# Altium footprint library Connector_Samtec_HLE_SMD.PcbLib: 290 footprints (part 10 of 24) (continued)
## Samtec_HLE-127-02-xxx-DV-BE_2x27_P2.54mm_Horizontal [mm]
pads (108):
  rect 1.27x1.68 smd: 1(-33.02,2.72) 2(-33.02,-2.72) 3(-30.48,2.72) 4(-30.48,-2.72) 5(-27.94,2.72) 6(-27.94,-2.72) 7(-25.4,2.72) 8(-25.4,-2.72) 9(-22.86,2.72) 10(-22.86,-2.72) 11(-20.32,2.72) 12(-20.32,-2.72) 13(-17.78,2.72) 14(-17.78,-2.72) 15(-15.24,2.72) 16(-15.24,-2.72) 17(-12.7,2.72) 18(-12.7,-2.72) 19(-10.16,2.72) 20(-10.16,-2.72) 21(-7.62,2.72) 22(-7.62,-2.72) 23(-5.08,2.72) 24(-5.08,-2.72) 25(-2.54,2.72) 26(-2.54,-2.72) 27(0,2.72) 28(0,-2.72) 29(2.54,2.72) 30(2.54,-2.72) 31(5.08,2.72) 32(5.08,-2.72) 33(7.62,2.72) 34(7.62,-2.72) 35(10.16,2.72) 36(10.16,-2.72) 37(12.7,2.72) 38(12.7,-2.72) 39(15.24,2.72) 40(15.24,-2.72) 41(17.78,2.72) 42(17.78,-2.72) 43(20.32,2.72) 44(20.32,-2.72) 45(22.86,2.72) 46(22.86,-2.72) 47(25.4,2.72) 48(25.4,-2.72) 49(27.94,2.72) 50(27.94,-2.72) 51(30.48,2.72) 52(30.48,-2.72) 53(33.02,2.72) 54(33.02,-2.72)
  round 0.97 hole 0.97: Un1(-2.54,-1.27) Un2(33.02,-1.27) Un3(-20.32,1.27) Un4(15.24,-1.27) Un5(-10.16,-1.27) Un6(12.7,1.27) Un7(-30.48,-1.27) Un8(15.24,1.27) Un9(2.54,1.27) Un10(-15.24,1.27) Un11(5.08,1.27) Un12(-27.94,1.27) Un13(-17.78,1.27) Un14(-27.94,-1.27) Un15(22.86,-1.27) Un16(25.4,1.27) Un17(-17.78,-1.27) Un18(-22.86,-1.27) Un19(-20.32,-1.27) Un20(-22.86,1.27) Un21(22.86,1.27) Un22(-25.4,1.27) Un23(5.08,-1.27) Un24(7.62,-1.27) Un25(-2.54,1.27) Un26(17.78,-1.27) Un27(-15.24,-1.27) Un28(20.32,1.27) Un29(30.48,1.27) Un30(-12.7,1.27) Un31(0,-1.27) Un32(-5.08,1.27) Un33(-7.62,-1.27) Un34(27.94,-1.27) Un35(-25.4,-1.27) Un36(-30.48,1.27) Un37(20.32,-1.27) Un38(-33.02,1.27) Un39(33.02,1.27) Un40(-33.02,-1.27) Un41(25.4,-1.27) Un42(-10.16,1.27) Un43(30.48,-1.27) Un44(27.94,1.27) Un45(12.7,-1.27) Un46(-7.62,1.27) Un47(0,1.27) Un48(2.54,-1.27) Un49(-5.08,-1.27) Un50(17.78,1.27) Un51(7.62,1.27) Un52(-12.7,-1.27) Un53(10.16,1.27) Un54(10.16,-1.27)
F.SilkS:
  lines w0.12: -33.915,-2.65 -34.4,-2.65 -34.4,2.65 -33.915,2.65 -33.915,3.56 ; -32.125,-2.65 -31.375,-2.65 ; -32.125,2.65 -31.375,2.65 ; -29.585,-2.65 -28.835,-2.65 ; -29.585,2.65 -28.835,2.65 ; -27.045,-2.65 -26.295,-2.65 ; -27.045,2.65 -26.295,2.65 ; -24.505,-2.65 -23.755,-2.65 ; -24.505,2.65 -23.755,2.65 ; -21.965,-2.65 -21.215,-2.65 ; -21.965,2.65 -21.215,2.65 ; -19.425,-2.65 -18.675,-2.65 ; -19.425,2.65 -18.675,2.65 ; -16.885,-2.65 -16.135,-2.65 ; -16.885,2.65 -16.135,2.65 ; -14.345,-2.65 -13.595,-2.65 ; -14.345,2.65 -13.595,2.65 ; -11.805,-2.65 -11.055,-2.65 ; -11.805,2.65 -11.055,2.65 ; -9.265,-2.65 -8.515,-2.65 ; -9.265,2.65 -8.515,2.65 ; -6.725,-2.65 -5.975,-2.65 ; -6.725,2.65 -5.975,2.65 ; -4.185,-2.65 -3.435,-2.65 ; -4.185,2.65 -3.435,2.65 ; -1.645,-2.65 -0.895,-2.65 ; -1.645,2.65 -0.895,2.65 ; 0.895,-2.65 1.645,-2.65 ; 0.895,2.65 1.645,2.65 ; 3.435,-2.65 4.185,-2.65 ; 3.435,2.65 4.185,2.65 ; 5.975,-2.65 6.725,-2.65 ; 5.975,2.65 6.725,2.65 ; 8.515,-2.65 9.265,-2.65 ; 8.515,2.65 9.265,2.65 ; 11.055,-2.65 11.805,-2.65 ; 11.055,2.65 11.805,2.65 ; 13.595,-2.65 14.345,-2.65 ; 13.595,2.65 14.345,2.65 ; 16.135,-2.65 16.885,-2.65 ; 16.135,2.65 16.885,2.65 ; 18.675,-2.65 19.425,-2.65 ; 18.675,2.65 19.425,2.65 ; 21.215,-2.65 21.965,-2.65 ; 21.215,2.65 21.965,2.65 ; 23.755,-2.65 24.505,-2.65 ; 23.755,2.65 24.505,2.65 ; 26.295,-2.65 27.045,-2.65 ; 26.295,2.65 27.045,2.65 ; 28.835,-2.65 29.585,-2.65 ; 28.835,2.65 29.585,2.65 ; 31.375,-2.65 32.125,-2.65 ; 31.375,2.65 32.125,2.65 ; 33.915,-2.65 34.4,-2.65 34.4,2.65 33.915,2.65
F.CrtYd:
  lines w0.05: -34.79,-4.06 -34.79,4.06 34.79,4.06 34.79,-4.06 -34.79,-4.06
F.Fab:
  lines w0.1: -33.52,2.54 -33.02,1.833 -32.52,2.54 ; -34.29,-2.54 34.29,-2.54 34.29,2.54 -34.29,2.54 -34.29,-2.54
  text "'.Designator'" at -4.047,-2.68 h1

## Samtec_HLE-127-02-xxx-DV-LC_2x27_P2.54mm_Horizontal [mm]
pads (56):
  rect 1.27x2.29 smd: 1(-33.02,2.525) 2(-33.02,-2.525) 3(-30.48,2.525) 4(-30.48,-2.525) 5(-27.94,2.525) 6(-27.94,-2.525) 7(-25.4,2.525) 8(-25.4,-2.525) 9(-22.86,2.525) 10(-22.86,-2.525) 11(-20.32,2.525) 12(-20.32,-2.525) 13(-17.78,2.525) 14(-17.78,-2.525) 15(-15.24,2.525) 16(-15.24,-2.525) 17(-12.7,2.525) 18(-12.7,-2.525) 19(-10.16,2.525) 20(-10.16,-2.525) 21(-7.62,2.525) 22(-7.62,-2.525) 23(-5.08,2.525) 24(-5.08,-2.525) 25(-2.54,2.525) 26(-2.54,-2.525) 27(0,2.525) 28(0,-2.525) 29(2.54,2.525) 30(2.54,-2.525) 31(5.08,2.525) 32(5.08,-2.525) 33(7.62,2.525) 34(7.62,-2.525) 35(10.16,2.525) 36(10.16,-2.525) 37(12.7,2.525) 38(12.7,-2.525) 39(15.24,2.525) 40(15.24,-2.525) 41(17.78,2.525) 42(17.78,-2.525) 43(20.32,2.525) 44(20.32,-2.525) 45(22.86,2.525) 46(22.86,-2.525) 47(25.4,2.525) 48(25.4,-2.525) 49(27.94,2.525) 50(27.94,-2.525) 51(30.48,2.525) 52(30.48,-2.525) 53(33.02,2.525) 54(33.02,-2.525)
  round 1.19 hole 1.19: Un1(-31.75,0) Un2(31.75,0)
F.SilkS:
  lines w0.12: -33.915,-2.65 -34.4,-2.65 -34.4,2.65 -33.915,2.65 -33.915,3.67 ; -32.125,-2.65 -31.375,-2.65 ; -32.125,2.65 -31.375,2.65 ; -29.585,-2.65 -28.835,-2.65 ; -29.585,2.65 -28.835,2.65 ; -27.045,-2.65 -26.295,-2.65 ; -27.045,2.65 -26.295,2.65 ; -24.505,-2.65 -23.755,-2.65 ; -24.505,2.65 -23.755,2.65 ; -21.965,-2.65 -21.215,-2.65 ; -21.965,2.65 -21.215,2.65 ; -19.425,-2.65 -18.675,-2.65 ; -19.425,2.65 -18.675,2.65 ; -16.885,-2.65 -16.135,-2.65 ; -16.885,2.65 -16.135,2.65 ; -14.345,-2.65 -13.595,-2.65 ; -14.345,2.65 -13.595,2.65 ; -11.805,-2.65 -11.055,-2.65 ; -11.805,2.65 -11.055,2.65 ; -9.265,-2.65 -8.515,-2.65 ; -9.265,2.65 -8.515,2.65 ; -6.725,-2.65 -5.975,-2.65 ; -6.725,2.65 -5.975,2.65 ; -4.185,-2.65 -3.435,-2.65 ; -4.185,2.65 -3.435,2.65 ; -1.645,-2.65 -0.895,-2.65 ; -1.645,2.65 -0.895,2.65 ; 0.895,-2.65 1.645,-2.65 ; 0.895,2.65 1.645,2.65 ; 3.435,-2.65 4.185,-2.65 ; 3.435,2.65 4.185,2.65 ; 5.975,-2.65 6.725,-2.65 ; 5.975,2.65 6.725,2.65 ; 8.515,-2.65 9.265,-2.65 ; 8.515,2.65 9.265,2.65 ; 11.055,-2.65 11.805,-2.65 ; 11.055,2.65 11.805,2.65 ; 13.595,-2.65 14.345,-2.65 ; 13.595,2.65 14.345,2.65 ; 16.135,-2.65 16.885,-2.65 ; 16.135,2.65 16.885,2.65 ; 18.675,-2.65 19.425,-2.65 ; 18.675,2.65 19.425,2.65 ; 21.215,-2.65 21.965,-2.65 ; 21.215,2.65 21.965,2.65 ; 23.755,-2.65 24.505,-2.65 ; 23.755,2.65 24.505,2.65 ; 26.295,-2.65 27.045,-2.65 ; 26.295,2.65 27.045,2.65 ; 28.835,-2.65 29.585,-2.65 ; 28.835,2.65 29.585,2.65 ; 31.375,-2.65 32.125,-2.65 ; 31.375,2.65 32.125,2.65 ; 33.915,-2.65 34.4,-2.65 34.4,2.65 33.915,2.65
F.CrtYd:
  lines w0.05: -34.79,-4.17 -34.79,4.17 34.79,4.17 34.79,-4.17 -34.79,-4.17
F.Fab:
  lines w0.1: -33.52,2.54 -33.02,1.833 -32.52,2.54 ; -34.29,-2.54 -34.29,2.54 34.29,2.54 34.29,-2.54 -34.29,-2.54
  text "'.Designator'" at -4.047,-2.68 h1

## Samtec_HLE-127-02-xxx-DV_2x27_P2.54mm_Horizontal [mm]
pads (54):
  rect 1.27x2.29 smd: 1(-33.02,2.525) 2(-33.02,-2.525) 3(-30.48,2.525) 4(-30.48,-2.525) 5(-27.94,2.525) 6(-27.94,-2.525) 7(-25.4,2.525) 8(-25.4,-2.525) 9(-22.86,2.525) 10(-22.86,-2.525) 11(-20.32,2.525) 12(-20.32,-2.525) 13(-17.78,2.525) 14(-17.78,-2.525) 15(-15.24,2.525) 16(-15.24,-2.525) 17(-12.7,2.525) 18(-12.7,-2.525) 19(-10.16,2.525) 20(-10.16,-2.525) 21(-7.62,2.525) 22(-7.62,-2.525) 23(-5.08,2.525) 24(-5.08,-2.525) 25(-2.54,2.525) 26(-2.54,-2.525) 27(0,2.525) 28(0,-2.525) 29(2.54,2.525) 30(2.54,-2.525) 31(5.08,2.525) 32(5.08,-2.525) 33(7.62,2.525) 34(7.62,-2.525) 35(10.16,2.525) 36(10.16,-2.525) 37(12.7,2.525) 38(12.7,-2.525) 39(15.24,2.525) 40(15.24,-2.525) 41(17.78,2.525) 42(17.78,-2.525) 43(20.32,2.525) 44(20.32,-2.525) 45(22.86,2.525) 46(22.86,-2.525) 47(25.4,2.525) 48(25.4,-2.525) 49(27.94,2.525) 50(27.94,-2.525) 51(30.48,2.525) 52(30.48,-2.525) 53(33.02,2.525) 54(33.02,-2.525)
F.SilkS:
  lines w0.12: -33.915,-2.65 -34.4,-2.65 -34.4,2.65 -33.915,2.65 -33.915,3.67 ; -32.125,-2.65 -31.375,-2.65 ; -32.125,2.65 -31.375,2.65 ; -29.585,-2.65 -28.835,-2.65 ; -29.585,2.65 -28.835,2.65 ; -27.045,-2.65 -26.295,-2.65 ; -27.045,2.65 -26.295,2.65 ; -24.505,-2.65 -23.755,-2.65 ; -24.505,2.65 -23.755,2.65 ; -21.965,-2.65 -21.215,-2.65 ; -21.965,2.65 -21.215,2.65 ; -19.425,-2.65 -18.675,-2.65 ; -19.425,2.65 -18.675,2.65 ; -16.885,-2.65 -16.135,-2.65 ; -16.885,2.65 -16.135,2.65 ; -14.345,-2.65 -13.595,-2.65 ; -14.345,2.65 -13.595,2.65 ; -11.805,-2.65 -11.055,-2.65 ; -11.805,2.65 -11.055,2.65 ; -9.265,-2.65 -8.515,-2.65 ; -9.265,2.65 -8.515,2.65 ; -6.725,-2.65 -5.975,-2.65 ; -6.725,2.65 -5.975,2.65 ; -4.185,-2.65 -3.435,-2.65 ; -4.185,2.65 -3.435,2.65 ; -1.645,-2.65 -0.895,-2.65 ; -1.645,2.65 -0.895,2.65 ; 0.895,-2.65 1.645,-2.65 ; 0.895,2.65 1.645,2.65 ; 3.435,-2.65 4.185,-2.65 ; 3.435,2.65 4.185,2.65 ; 5.975,-2.65 6.725,-2.65 ; 5.975,2.65 6.725,2.65 ; 8.515,-2.65 9.265,-2.65 ; 8.515,2.65 9.265,2.65 ; 11.055,-2.65 11.805,-2.65 ; 11.055,2.65 11.805,2.65 ; 13.595,-2.65 14.345,-2.65 ; 13.595,2.65 14.345,2.65 ; 16.135,-2.65 16.885,-2.65 ; 16.135,2.65 16.885,2.65 ; 18.675,-2.65 19.425,-2.65 ; 18.675,2.65 19.425,2.65 ; 21.215,-2.65 21.965,-2.65 ; 21.215,2.65 21.965,2.65 ; 23.755,-2.65 24.505,-2.65 ; 23.755,2.65 24.505,2.65 ; 26.295,-2.65 27.045,-2.65 ; 26.295,2.65 27.045,2.65 ; 28.835,-2.65 29.585,-2.65 ; 28.835,2.65 29.585,2.65 ; 31.375,-2.65 32.125,-2.65 ; 31.375,2.65 32.125,2.65 ; 33.915,-2.65 34.4,-2.65 34.4,2.65 33.915,2.65
F.CrtYd:
  lines w0.05: -34.79,-4.17 34.79,-4.17 34.79,4.17 -34.79,4.17 -34.79,-4.17
F.Fab:
  lines w0.1: -33.52,2.54 -33.02,1.833 -32.52,2.54 ; -34.29,-2.54 34.29,-2.54 34.29,2.54 -34.29,2.54 -34.29,-2.54
  text "'.Designator'" at -4.047,-2.68 h1

## Samtec_HLE-128-02-xxx-DV-A_2x28_P2.54mm_Horizontal [mm]
pads (58):
  rect 1.27x2.29 smd: 1(-34.29,2.525) 2(-34.29,-2.525) 3(-31.75,2.525) 4(-31.75,-2.525) 5(-29.21,2.525) 6(-29.21,-2.525) 7(-26.67,2.525) 8(-26.67,-2.525) 9(-24.13,2.525) 10(-24.13,-2.525) 11(-21.59,2.525) 12(-21.59,-2.525) 13(-19.05,2.525) 14(-19.05,-2.525) 15(-16.51,2.525) 16(-16.51,-2.525) 17(-13.97,2.525) 18(-13.97,-2.525) 19(-11.43,2.525) 20(-11.43,-2.525) 21(-8.89,2.525) 22(-8.89,-2.525) 23(-6.35,2.525) 24(-6.35,-2.525) 25(-3.81,2.525) 26(-3.81,-2.525) 27(-1.27,2.525) 28(-1.27,-2.525) 29(1.27,2.525) 30(1.27,-2.525) 31(3.81,2.525) 32(3.81,-2.525) 33(6.35,2.525) 34(6.35,-2.525) 35(8.89,2.525) 36(8.89,-2.525) 37(11.43,2.525) 38(11.43,-2.525) 39(13.97,2.525) 40(13.97,-2.525) 41(16.51,2.525) 42(16.51,-2.525) 43(19.05,2.525) 44(19.05,-2.525) 45(21.59,2.525) 46(21.59,-2.525) 47(24.13,2.525) 48(24.13,-2.525) 49(26.67,2.525) 50(26.67,-2.525) 51(29.21,2.525) 52(29.21,-2.525) 53(31.75,2.525) 54(31.75,-2.525) 55(34.29,2.525) 56(34.29,-2.525)
  round 1.78 hole 1.78: Un1(33.02,0) Un2(-33.02,0)
F.SilkS:
  lines w0.12: -35.185,-2.65 -35.67,-2.65 -35.67,2.65 -35.185,2.65 -35.185,3.67 ; -33.395,-2.65 -32.645,-2.65 ; -33.395,2.65 -32.645,2.65 ; -30.855,-2.65 -30.105,-2.65 ; -30.855,2.65 -30.105,2.65 ; -28.315,-2.65 -27.565,-2.65 ; -28.315,2.65 -27.565,2.65 ; -25.775,-2.65 -25.025,-2.65 ; -25.775,2.65 -25.025,2.65 ; -23.235,-2.65 -22.485,-2.65 ; -23.235,2.65 -22.485,2.65 ; -20.695,-2.65 -19.945,-2.65 ; -20.695,2.65 -19.945,2.65 ; -18.155,-2.65 -17.405,-2.65 ; -18.155,2.65 -17.405,2.65 ; -15.615,-2.65 -14.865,-2.65 ; -15.615,2.65 -14.865,2.65 ; -13.075,-2.65 -12.325,-2.65 ; -13.075,2.65 -12.325,2.65 ; -10.535,-2.65 -9.785,-2.65 ; -10.535,2.65 -9.785,2.65 ; -7.995,-2.65 -7.245,-2.65 ; -7.995,2.65 -7.245,2.65 ; -5.455,-2.65 -4.705,-2.65 ; -5.455,2.65 -4.705,2.65 ; -2.915,-2.65 -2.165,-2.65 ; -2.915,2.65 -2.165,2.65 ; -0.375,-2.65 0.375,-2.65 ; -0.375,2.65 0.375,2.65 ; 2.165,-2.65 2.915,-2.65 ; 2.165,2.65 2.915,2.65 ; 4.705,-2.65 5.455,-2.65 ; 4.705,2.65 5.455,2.65 ; 7.245,-2.65 7.995,-2.65 ; 7.245,2.65 7.995,2.65 ; 9.785,-2.65 10.535,-2.65 ; 9.785,2.65 10.535,2.65 ; 12.325,-2.65 13.075,-2.65 ; 12.325,2.65 13.075,2.65 ; 14.865,-2.65 15.615,-2.65 ; 14.865,2.65 15.615,2.65 ; 17.405,-2.65 18.155,-2.65 ; 17.405,2.65 18.155,2.65 ; 19.945,-2.65 20.695,-2.65 ; 19.945,2.65 20.695,2.65 ; 22.485,-2.65 23.235,-2.65 ; 22.485,2.65 23.235,2.65 ; 25.025,-2.65 25.775,-2.65 ; 25.025,2.65 25.775,2.65 ; 27.565,-2.65 28.315,-2.65 ; 27.565,2.65 28.315,2.65 ; 30.105,-2.65 30.855,-2.65 ; 30.105,2.65 30.855,2.65 ; 32.645,-2.65 33.395,-2.65 ; 32.645,2.65 33.395,2.65 ; 35.185,-2.65 35.67,-2.65 35.67,2.65 35.185,2.65
F.CrtYd:
  lines w0.05: -36.06,-4.17 -36.06,4.17 36.06,4.17 36.06,-4.17 -36.06,-4.17
F.Fab:
  lines w0.1: -34.79,2.54 -34.29,1.833 -33.79,2.54 ; -35.56,-2.54 -35.56,2.54 35.56,2.54 35.56,-2.54 -35.56,-2.54
  text "'.Designator'" at -4.047,-2.68 h1

## Samtec_HLE-128-02-xxx-DV-BE-A_2x28_P2.54mm_Horizontal [mm]
pads (114):
  rect 1.27x1.68 smd: 1(-34.29,2.72) 2(-34.29,-2.72) 3(-31.75,2.72) 4(-31.75,-2.72) 5(-29.21,2.72) 6(-29.21,-2.72) 7(-26.67,2.72) 8(-26.67,-2.72) 9(-24.13,2.72) 10(-24.13,-2.72) 11(-21.59,2.72) 12(-21.59,-2.72) 13(-19.05,2.72) 14(-19.05,-2.72) 15(-16.51,2.72) 16(-16.51,-2.72) 17(-13.97,2.72) 18(-13.97,-2.72) 19(-11.43,2.72) 20(-11.43,-2.72) 21(-8.89,2.72) 22(-8.89,-2.72) 23(-6.35,2.72) 24(-6.35,-2.72) 25(-3.81,2.72) 26(-3.81,-2.72) 27(-1.27,2.72) 28(-1.27,-2.72) 29(1.27,2.72) 30(1.27,-2.72) 31(3.81,2.72) 32(3.81,-2.72) 33(6.35,2.72) 34(6.35,-2.72) 35(8.89,2.72) 36(8.89,-2.72) 37(11.43,2.72) 38(11.43,-2.72) 39(13.97,2.72) 40(13.97,-2.72) 41(16.51,2.72) 42(16.51,-2.72) 43(19.05,2.72) 44(19.05,-2.72) 45(21.59,2.72) 46(21.59,-2.72) 47(24.13,2.72) 48(24.13,-2.72) 49(26.67,2.72) 50(26.67,-2.72) 51(29.21,2.72) 52(29.21,-2.72) 53(31.75,2.72) 54(31.75,-2.72) 55(34.29,2.72) 56(34.29,-2.72)
  round 0.97 hole 0.97: Un1(-19.05,-1.27) Un2(-24.13,-1.27) Un3(8.89,1.27) Un4(-31.75,-1.27) Un5(1.27,-1.27) Un6(1.27,1.27) Un7(-6.35,-1.27) Un8(-29.21,-1.27) Un9(-31.75,1.27) Un10(-26.67,1.27) Un11(3.81,1.27) Un12(19.05,1.27) Un13(-16.51,-1.27) Un14(19.05,-1.27) Un15(24.13,-1.27) Un16(21.59,1.27) Un18(6.35,-1.27) Un19(29.21,1.27) Un20(-8.89,-1.27) Un21(26.67,1.27) Un22(34.29,1.27) Un23(-16.51,1.27) Un24(16.51,1.27) Un25(-21.59,1.27) Un26(-6.35,1.27) Un27(-19.05,1.27) Un28(-34.29,1.27) Un29(-24.13,1.27) Un30(8.89,-1.27) Un31(-13.97,1.27) Un32(-29.21,1.27) Un33(16.51,-1.27) Un34(-11.43,1.27) Un35(-3.81,1.27) Un36(3.81,-1.27) Un37(-1.27,1.27) Un38(31.75,-1.27) Un40(-1.27,-1.27) Un41(24.13,1.27) Un42(11.43,-1.27) Un43(11.43,1.27) Un44(13.97,1.27) Un45(34.29,-1.27) Un46(29.21,-1.27) Un47(13.97,-1.27) Un48(31.75,1.27) Un49(6.35,1.27) Un50(-13.97,-1.27) Un51(-34.29,-1.27) Un52(-21.59,-1.27) Un53(-11.43,-1.27) Un54(-26.67,-1.27) Un55(21.59,-1.27) Un56(-8.89,1.27) Un57(26.67,-1.27) Un58(-3.81,-1.27)
  round 1.78 hole 1.78: Un17(-33.02,0) Un39(33.02,0)
F.SilkS:
  lines w0.12: -35.185,-2.65 -35.67,-2.65 -35.67,2.65 -35.185,2.65 -35.185,3.56 ; -33.395,-2.65 -32.645,-2.65 ; -33.395,2.65 -32.645,2.65 ; -30.855,-2.65 -30.105,-2.65 ; -30.855,2.65 -30.105,2.65 ; -28.315,-2.65 -27.565,-2.65 ; -28.315,2.65 -27.565,2.65 ; -25.775,-2.65 -25.025,-2.65 ; -25.775,2.65 -25.025,2.65 ; -23.235,-2.65 -22.485,-2.65 ; -23.235,2.65 -22.485,2.65 ; -20.695,-2.65 -19.945,-2.65 ; -20.695,2.65 -19.945,2.65 ; -18.155,-2.65 -17.405,-2.65 ; -18.155,2.65 -17.405,2.65 ; -15.615,-2.65 -14.865,-2.65 ; -15.615,2.65 -14.865,2.65 ; -13.075,-2.65 -12.325,-2.65 ; -13.075,2.65 -12.325,2.65 ; -10.535,-2.65 -9.785,-2.65 ; -10.535,2.65 -9.785,2.65 ; -7.995,-2.65 -7.245,-2.65 ; -7.995,2.65 -7.245,2.65 ; -5.455,-2.65 -4.705,-2.65 ; -5.455,2.65 -4.705,2.65 ; -2.915,-2.65 -2.165,-2.65 ; -2.915,2.65 -2.165,2.65 ; -0.375,-2.65 0.375,-2.65 ; -0.375,2.65 0.375,2.65 ; 2.165,-2.65 2.915,-2.65 ; 2.165,2.65 2.915,2.65 ; 4.705,-2.65 5.455,-2.65 ; 4.705,2.65 5.455,2.65 ; 7.245,-2.65 7.995,-2.65 ; 7.245,2.65 7.995,2.65 ; 9.785,-2.65 10.535,-2.65 ; 9.785,2.65 10.535,2.65 ; 12.325,-2.65 13.075,-2.65 ; 12.325,2.65 13.075,2.65 ; 14.865,-2.65 15.615,-2.65 ; 14.865,2.65 15.615,2.65 ; 17.405,-2.65 18.155,-2.65 ; 17.405,2.65 18.155,2.65 ; 19.945,-2.65 20.695,-2.65 ; 19.945,2.65 20.695,2.65 ; 22.485,-2.65 23.235,-2.65 ; 22.485,2.65 23.235,2.65 ; 25.025,-2.65 25.775,-2.65 ; 25.025,2.65 25.775,2.65 ; 27.565,-2.65 28.315,-2.65 ; 27.565,2.65 28.315,2.65 ; 30.105,-2.65 30.855,-2.65 ; 30.105,2.65 30.855,2.65 ; 32.645,-2.65 33.395,-2.65 ; 32.645,2.65 33.395,2.65 ; 35.185,-2.65 35.67,-2.65 35.67,2.65 35.185,2.65
F.CrtYd:
  lines w0.05: -36.06,-4.06 -36.06,4.06 36.06,4.06 36.06,-4.06 -36.06,-4.06
F.Fab:
  lines w0.1: -34.79,2.54 -34.29,1.833 -33.79,2.54 ; -35.56,-2.54 35.56,-2.54 35.56,2.54 -35.56,2.54 -35.56,-2.54
  text "'.Designator'" at -4.047,-2.68 h1

## Samtec_HLE-128-02-xxx-DV-BE-LC_2x28_P2.54mm_Horizontal [mm]
pads (114):
  rect 1.27x1.68 smd: 1(-34.29,2.72) 2(-34.29,-2.72) 3(-31.75,2.72) 4(-31.75,-2.72) 5(-29.21,2.72) 6(-29.21,-2.72) 7(-26.67,2.72) 8(-26.67,-2.72) 9(-24.13,2.72) 10(-24.13,-2.72) 11(-21.59,2.72) 12(-21.59,-2.72) 13(-19.05,2.72) 14(-19.05,-2.72) 15(-16.51,2.72) 16(-16.51,-2.72) 17(-13.97,2.72) 18(-13.97,-2.72) 19(-11.43,2.72) 20(-11.43,-2.72) 21(-8.89,2.72) 22(-8.89,-2.72) 23(-6.35,2.72) 24(-6.35,-2.72) 25(-3.81,2.72) 26(-3.81,-2.72) 27(-1.27,2.72) 28(-1.27,-2.72) 29(1.27,2.72) 30(1.27,-2.72) 31(3.81,2.72) 32(3.81,-2.72) 33(6.35,2.72) 34(6.35,-2.72) 35(8.89,2.72) 36(8.89,-2.72) 37(11.43,2.72) 38(11.43,-2.72) 39(13.97,2.72) 40(13.97,-2.72) 41(16.51,2.72) 42(16.51,-2.72) 43(19.05,2.72) 44(19.05,-2.72) 45(21.59,2.72) 46(21.59,-2.72) 47(24.13,2.72) 48(24.13,-2.72) 49(26.67,2.72) 50(26.67,-2.72) 51(29.21,2.72) 52(29.21,-2.72) 53(31.75,2.72) 54(31.75,-2.72) 55(34.29,2.72) 56(34.29,-2.72)
  round 0.97 hole 0.97: Un1(-26.67,-1.27) Un2(13.97,-1.27) Un3(19.05,-1.27) Un4(19.05,1.27) Un5(-24.13,-1.27) Un6(-26.67,1.27) Un7(-6.35,-1.27) Un8(-34.29,1.27) Un9(11.43,-1.27) Un10(3.81,1.27) Un11(29.21,-1.27) Un12(-16.51,-1.27) Un13(6.35,-1.27) Un14(-1.27,-1.27) Un15(-3.81,1.27) Un16(11.43,1.27) Un17(-34.29,-1.27) Un18(-31.75,-1.27) Un19(-3.81,-1.27) Un20(31.75,1.27) Un21(29.21,1.27) Un22(-29.21,1.27) Un23(-6.35,1.27) Un24(26.67,-1.27) Un25(1.27,-1.27) Un26(8.89,-1.27) Un27(-8.89,1.27) Un28(34.29,-1.27) Un29(3.81,-1.27) Un30(-24.13,1.27) Un31(-19.05,1.27) Un32(-1.27,1.27) Un33(34.29,1.27) Un34(21.59,1.27) Un35(-13.97,1.27) Un36(16.51,1.27) Un37(13.97,1.27) Un38(8.89,1.27) Un39(31.75,-1.27) Un40(-29.21,-1.27) Un41(1.27,1.27) Un42(-19.05,-1.27) Un44(6.35,1.27) Un46(-21.59,-1.27) Un47(-31.75,1.27) Un48(24.13,1.27) Un49(-11.43,-1.27) Un50(-8.89,-1.27) Un51(24.13,-1.27) Un52(-11.43,1.27) Un53(-16.51,1.27) Un54(26.67,1.27) Un55(21.59,-1.27) Un56(-13.97,-1.27) Un57(-21.59,1.27) Un58(16.51,-1.27)
  round 1.19 hole 1.19: Un43(33.02,0) Un45(-33.02,0)
F.SilkS:
  lines w0.12: -35.185,-2.65 -35.67,-2.65 -35.67,2.65 -35.185,2.65 -35.185,3.56 ; -33.395,-2.65 -32.645,-2.65 ; -33.395,2.65 -32.645,2.65 ; -30.855,-2.65 -30.105,-2.65 ; -30.855,2.65 -30.105,2.65 ; -28.315,-2.65 -27.565,-2.65 ; -28.315,2.65 -27.565,2.65 ; -25.775,-2.65 -25.025,-2.65 ; -25.775,2.65 -25.025,2.65 ; -23.235,-2.65 -22.485,-2.65 ; -23.235,2.65 -22.485,2.65 ; -20.695,-2.65 -19.945,-2.65 ; -20.695,2.65 -19.945,2.65 ; -18.155,-2.65 -17.405,-2.65 ; -18.155,2.65 -17.405,2.65 ; -15.615,-2.65 -14.865,-2.65 ; -15.615,2.65 -14.865,2.65 ; -13.075,-2.65 -12.325,-2.65 ; -13.075,2.65 -12.325,2.65 ; -10.535,-2.65 -9.785,-2.65 ; -10.535,2.65 -9.785,2.65 ; -7.995,-2.65 -7.245,-2.65 ; -7.995,2.65 -7.245,2.65 ; -5.455,-2.65 -4.705,-2.65 ; -5.455,2.65 -4.705,2.65 ; -2.915,-2.65 -2.165,-2.65 ; -2.915,2.65 -2.165,2.65 ; -0.375,-2.65 0.375,-2.65 ; -0.375,2.65 0.375,2.65 ; 2.165,-2.65 2.915,-2.65 ; 2.165,2.65 2.915,2.65 ; 4.705,-2.65 5.455,-2.65 ; 4.705,2.65 5.455,2.65 ; 7.245,-2.65 7.995,-2.65 ; 7.245,2.65 7.995,2.65 ; 9.785,-2.65 10.535,-2.65 ; 9.785,2.65 10.535,2.65 ; 12.325,-2.65 13.075,-2.65 ; 12.325,2.65 13.075,2.65 ; 14.865,-2.65 15.615,-2.65 ; 14.865,2.65 15.615,2.65 ; 17.405,-2.65 18.155,-2.65 ; 17.405,2.65 18.155,2.65 ; 19.945,-2.65 20.695,-2.65 ; 19.945,2.65 20.695,2.65 ; 22.485,-2.65 23.235,-2.65 ; 22.485,2.65 23.235,2.65 ; 25.025,-2.65 25.775,-2.65 ; 25.025,2.65 25.775,2.65 ; 27.565,-2.65 28.315,-2.65 ; 27.565,2.65 28.315,2.65 ; 30.105,-2.65 30.855,-2.65 ; 30.105,2.65 30.855,2.65 ; 32.645,-2.65 33.395,-2.65 ; 32.645,2.65 33.395,2.65 ; 35.185,-2.65 35.67,-2.65 35.67,2.65 35.185,2.65
F.CrtYd:
  lines w0.05: -36.06,-4.06 36.06,-4.06 36.06,4.06 -36.06,4.06 -36.06,-4.06
F.Fab:
  lines w0.1: -34.79,2.54 -34.29,1.833 -33.79,2.54 ; -35.56,-2.54 35.56,-2.54 35.56,2.54 -35.56,2.54 -35.56,-2.54
  text "'.Designator'" at -4.047,-2.68 h1

## Samtec_HLE-128-02-xxx-DV-BE_2x28_P2.54mm_Horizontal [mm]
pads (112):
  rect 1.27x1.68 smd: 1(-34.29,2.72) 2(-34.29,-2.72) 3(-31.75,2.72) 4(-31.75,-2.72) 5(-29.21,2.72) 6(-29.21,-2.72) 7(-26.67,2.72) 8(-26.67,-2.72) 9(-24.13,2.72) 10(-24.13,-2.72) 11(-21.59,2.72) 12(-21.59,-2.72) 13(-19.05,2.72) 14(-19.05,-2.72) 15(-16.51,2.72) 16(-16.51,-2.72) 17(-13.97,2.72) 18(-13.97,-2.72) 19(-11.43,2.72) 20(-11.43,-2.72) 21(-8.89,2.72) 22(-8.89,-2.72) 23(-6.35,2.72) 24(-6.35,-2.72) 25(-3.81,2.72) 26(-3.81,-2.72) 27(-1.27,2.72) 28(-1.27,-2.72) 29(1.27,2.72) 30(1.27,-2.72) 31(3.81,2.72) 32(3.81,-2.72) 33(6.35,2.72) 34(6.35,-2.72) 35(8.89,2.72) 36(8.89,-2.72) 37(11.43,2.72) 38(11.43,-2.72) 39(13.97,2.72) 40(13.97,-2.72) 41(16.51,2.72) 42(16.51,-2.72) 43(19.05,2.72) 44(19.05,-2.72) 45(21.59,2.72) 46(21.59,-2.72) 47(24.13,2.72) 48(24.13,-2.72) 49(26.67,2.72) 50(26.67,-2.72) 51(29.21,2.72) 52(29.21,-2.72) 53(31.75,2.72) 54(31.75,-2.72) 55(34.29,2.72) 56(34.29,-2.72)
  round 0.97 hole 0.97: Un1(-16.51,-1.27) Un2(1.27,-1.27) Un3(-3.81,-1.27) Un4(-26.67,-1.27) Un5(-34.29,1.27) Un6(11.43,1.27) Un7(29.21,1.27) Un8(16.51,-1.27) Un9(-16.51,1.27) Un10(6.35,-1.27) Un11(6.35,1.27) Un12(-1.27,-1.27) Un13(-31.75,1.27) Un14(-11.43,-1.27) Un15(-8.89,-1.27) Un16(11.43,-1.27) Un17(-6.35,1.27) Un18(-6.35,-1.27) Un19(-13.97,-1.27) Un20(-8.89,1.27) Un21(13.97,1.27) Un22(-31.75,-1.27) Un23(-29.21,1.27) Un24(16.51,1.27) Un25(13.97,-1.27) Un26(8.89,-1.27) Un27(-24.13,-1.27) Un28(-3.81,1.27) Un29(31.75,1.27) Un30(-29.21,-1.27) Un31(19.05,-1.27) Un32(24.13,1.27) Un33(1.27,1.27) Un34(3.81,1.27) Un35(-34.29,-1.27) Un36(21.59,1.27) Un37(-26.67,1.27) Un38(19.05,1.27) Un39(24.13,-1.27) Un40(-21.59,1.27) Un41(31.75,-1.27) Un42(-24.13,1.27) Un43(34.29,-1.27) Un44(34.29,1.27) Un45(26.67,-1.27) Un46(-19.05,1.27) Un47(21.59,-1.27) Un48(-1.27,1.27) Un49(29.21,-1.27) Un50(-11.43,1.27) Un51(-19.05,-1.27) Un52(-13.97,1.27) Un53(26.67,1.27) Un54(-21.59,-1.27) Un55(3.81,-1.27) Un56(8.89,1.27)
F.SilkS:
  lines w0.12: -35.185,-2.65 -35.67,-2.65 -35.67,2.65 -35.185,2.65 -35.185,3.56 ; -33.395,-2.65 -32.645,-2.65 ; -33.395,2.65 -32.645,2.65 ; -30.855,-2.65 -30.105,-2.65 ; -30.855,2.65 -30.105,2.65 ; -28.315,-2.65 -27.565,-2.65 ; -28.315,2.65 -27.565,2.65 ; -25.775,-2.65 -25.025,-2.65 ; -25.775,2.65 -25.025,2.65 ; -23.235,-2.65 -22.485,-2.65 ; -23.235,2.65 -22.485,2.65 ; -20.695,-2.65 -19.945,-2.65 ; -20.695,2.65 -19.945,2.65 ; -18.155,-2.65 -17.405,-2.65 ; -18.155,2.65 -17.405,2.65 ; -15.615,-2.65 -14.865,-2.65 ; -15.615,2.65 -14.865,2.65 ; -13.075,-2.65 -12.325,-2.65 ; -13.075,2.65 -12.325,2.65 ; -10.535,-2.65 -9.785,-2.65 ; -10.535,2.65 -9.785,2.65 ; -7.995,-2.65 -7.245,-2.65 ; -7.995,2.65 -7.245,2.65 ; -5.455,-2.65 -4.705,-2.65 ; -5.455,2.65 -4.705,2.65 ; -2.915,-2.65 -2.165,-2.65 ; -2.915,2.65 -2.165,2.65 ; -0.375,-2.65 0.375,-2.65 ; -0.375,2.65 0.375,2.65 ; 2.165,-2.65 2.915,-2.65 ; 2.165,2.65 2.915,2.65 ; 4.705,-2.65 5.455,-2.65 ; 4.705,2.65 5.455,2.65 ; 7.245,-2.65 7.995,-2.65 ; 7.245,2.65 7.995,2.65 ; 9.785,-2.65 10.535,-2.65 ; 9.785,2.65 10.535,2.65 ; 12.325,-2.65 13.075,-2.65 ; 12.325,2.65 13.075,2.65 ; 14.865,-2.65 15.615,-2.65 ; 14.865,2.65 15.615,2.65 ; 17.405,-2.65 18.155,-2.65 ; 17.405,2.65 18.155,2.65 ; 19.945,-2.65 20.695,-2.65 ; 19.945,2.65 20.695,2.65 ; 22.485,-2.65 23.235,-2.65 ; 22.485,2.65 23.235,2.65 ; 25.025,-2.65 25.775,-2.65 ; 25.025,2.65 25.775,2.65 ; 27.565,-2.65 28.315,-2.65 ; 27.565,2.65 28.315,2.65 ; 30.105,-2.65 30.855,-2.65 ; 30.105,2.65 30.855,2.65 ; 32.645,-2.65 33.395,-2.65 ; 32.645,2.65 33.395,2.65 ; 35.185,-2.65 35.67,-2.65 35.67,2.65 35.185,2.65
F.CrtYd:
  lines w0.05: -36.06,-4.06 36.06,-4.06 36.06,4.06 -36.06,4.06 -36.06,-4.06
F.Fab:
  lines w0.1: -34.79,2.54 -34.29,1.833 -33.79,2.54 ; -35.56,-2.54 -35.56,2.54 35.56,2.54 35.56,-2.54 -35.56,-2.54
  text "'.Designator'" at -4.047,-2.68 h1

## Samtec_HLE-128-02-xxx-DV-LC_2x28_P2.54mm_Horizontal [mm]
pads (58):
  rect 1.27x2.29 smd: 1(-34.29,2.525) 2(-34.29,-2.525) 3(-31.75,2.525) 4(-31.75,-2.525) 5(-29.21,2.525) 6(-29.21,-2.525) 7(-26.67,2.525) 8(-26.67,-2.525) 9(-24.13,2.525) 10(-24.13,-2.525) 11(-21.59,2.525) 12(-21.59,-2.525) 13(-19.05,2.525) 14(-19.05,-2.525) 15(-16.51,2.525) 16(-16.51,-2.525) 17(-13.97,2.525) 18(-13.97,-2.525) 19(-11.43,2.525) 20(-11.43,-2.525) 21(-8.89,2.525) 22(-8.89,-2.525) 23(-6.35,2.525) 24(-6.35,-2.525) 25(-3.81,2.525) 26(-3.81,-2.525) 27(-1.27,2.525) 28(-1.27,-2.525) 29(1.27,2.525) 30(1.27,-2.525) 31(3.81,2.525) 32(3.81,-2.525) 33(6.35,2.525) 34(6.35,-2.525) 35(8.89,2.525) 36(8.89,-2.525) 37(11.43,2.525) 38(11.43,-2.525) 39(13.97,2.525) 40(13.97,-2.525) 41(16.51,2.525) 42(16.51,-2.525) 43(19.05,2.525) 44(19.05,-2.525) 45(21.59,2.525) 46(21.59,-2.525) 47(24.13,2.525) 48(24.13,-2.525) 49(26.67,2.525) 50(26.67,-2.525) 51(29.21,2.525) 52(29.21,-2.525) 53(31.75,2.525) 54(31.75,-2.525) 55(34.29,2.525) 56(34.29,-2.525)
  round 1.19 hole 1.19: Un1(-33.02,0) Un2(33.02,0)
F.SilkS:
  lines w0.12: -35.185,-2.65 -35.67,-2.65 -35.67,2.65 -35.185,2.65 -35.185,3.67 ; -33.395,-2.65 -32.645,-2.65 ; -33.395,2.65 -32.645,2.65 ; -30.855,-2.65 -30.105,-2.65 ; -30.855,2.65 -30.105,2.65 ; -28.315,-2.65 -27.565,-2.65 ; -28.315,2.65 -27.565,2.65 ; -25.775,-2.65 -25.025,-2.65 ; -25.775,2.65 -25.025,2.65 ; -23.235,-2.65 -22.485,-2.65 ; -23.235,2.65 -22.485,2.65 ; -20.695,-2.65 -19.945,-2.65 ; -20.695,2.65 -19.945,2.65 ; -18.155,-2.65 -17.405,-2.65 ; -18.155,2.65 -17.405,2.65 ; -15.615,-2.65 -14.865,-2.65 ; -15.615,2.65 -14.865,2.65 ; -13.075,-2.65 -12.325,-2.65 ; -13.075,2.65 -12.325,2.65 ; -10.535,-2.65 -9.785,-2.65 ; -10.535,2.65 -9.785,2.65 ; -7.995,-2.65 -7.245,-2.65 ; -7.995,2.65 -7.245,2.65 ; -5.455,-2.65 -4.705,-2.65 ; -5.455,2.65 -4.705,2.65 ; -2.915,-2.65 -2.165,-2.65 ; -2.915,2.65 -2.165,2.65 ; -0.375,-2.65 0.375,-2.65 ; -0.375,2.65 0.375,2.65 ; 2.165,-2.65 2.915,-2.65 ; 2.165,2.65 2.915,2.65 ; 4.705,-2.65 5.455,-2.65 ; 4.705,2.65 5.455,2.65 ; 7.245,-2.65 7.995,-2.65 ; 7.245,2.65 7.995,2.65 ; 9.785,-2.65 10.535,-2.65 ; 9.785,2.65 10.535,2.65 ; 12.325,-2.65 13.075,-2.65 ; 12.325,2.65 13.075,2.65 ; 14.865,-2.65 15.615,-2.65 ; 14.865,2.65 15.615,2.65 ; 17.405,-2.65 18.155,-2.65 ; 17.405,2.65 18.155,2.65 ; 19.945,-2.65 20.695,-2.65 ; 19.945,2.65 20.695,2.65 ; 22.485,-2.65 23.235,-2.65 ; 22.485,2.65 23.235,2.65 ; 25.025,-2.65 25.775,-2.65 ; 25.025,2.65 25.775,2.65 ; 27.565,-2.65 28.315,-2.65 ; 27.565,2.65 28.315,2.65 ; 30.105,-2.65 30.855,-2.65 ; 30.105,2.65 30.855,2.65 ; 32.645,-2.65 33.395,-2.65 ; 32.645,2.65 33.395,2.65 ; 35.185,-2.65 35.67,-2.65 35.67,2.65 35.185,2.65
F.CrtYd:
  lines w0.05: -36.06,-4.17 -36.06,4.17 36.06,4.17 36.06,-4.17 -36.06,-4.17
F.Fab:
  lines w0.1: -34.79,2.54 -34.29,1.833 -33.79,2.54 ; -35.56,-2.54 -35.56,2.54 35.56,2.54 35.56,-2.54 -35.56,-2.54
  text "'.Designator'" at -4.047,-2.68 h1